# Altium footprint library hphonglib.PcbLib: 1250 footprints (part 50 of 79)
Each footprint in its own frame and in the unit in brackets; x right, y up, seen from the top. Pads: shape width x height; smd on the part's side, far side on the other; paste and mask are expansions set on the pad; w line width, h text height; cw(c..) or ccw(c..) is an arc to the next point about the centre after c.
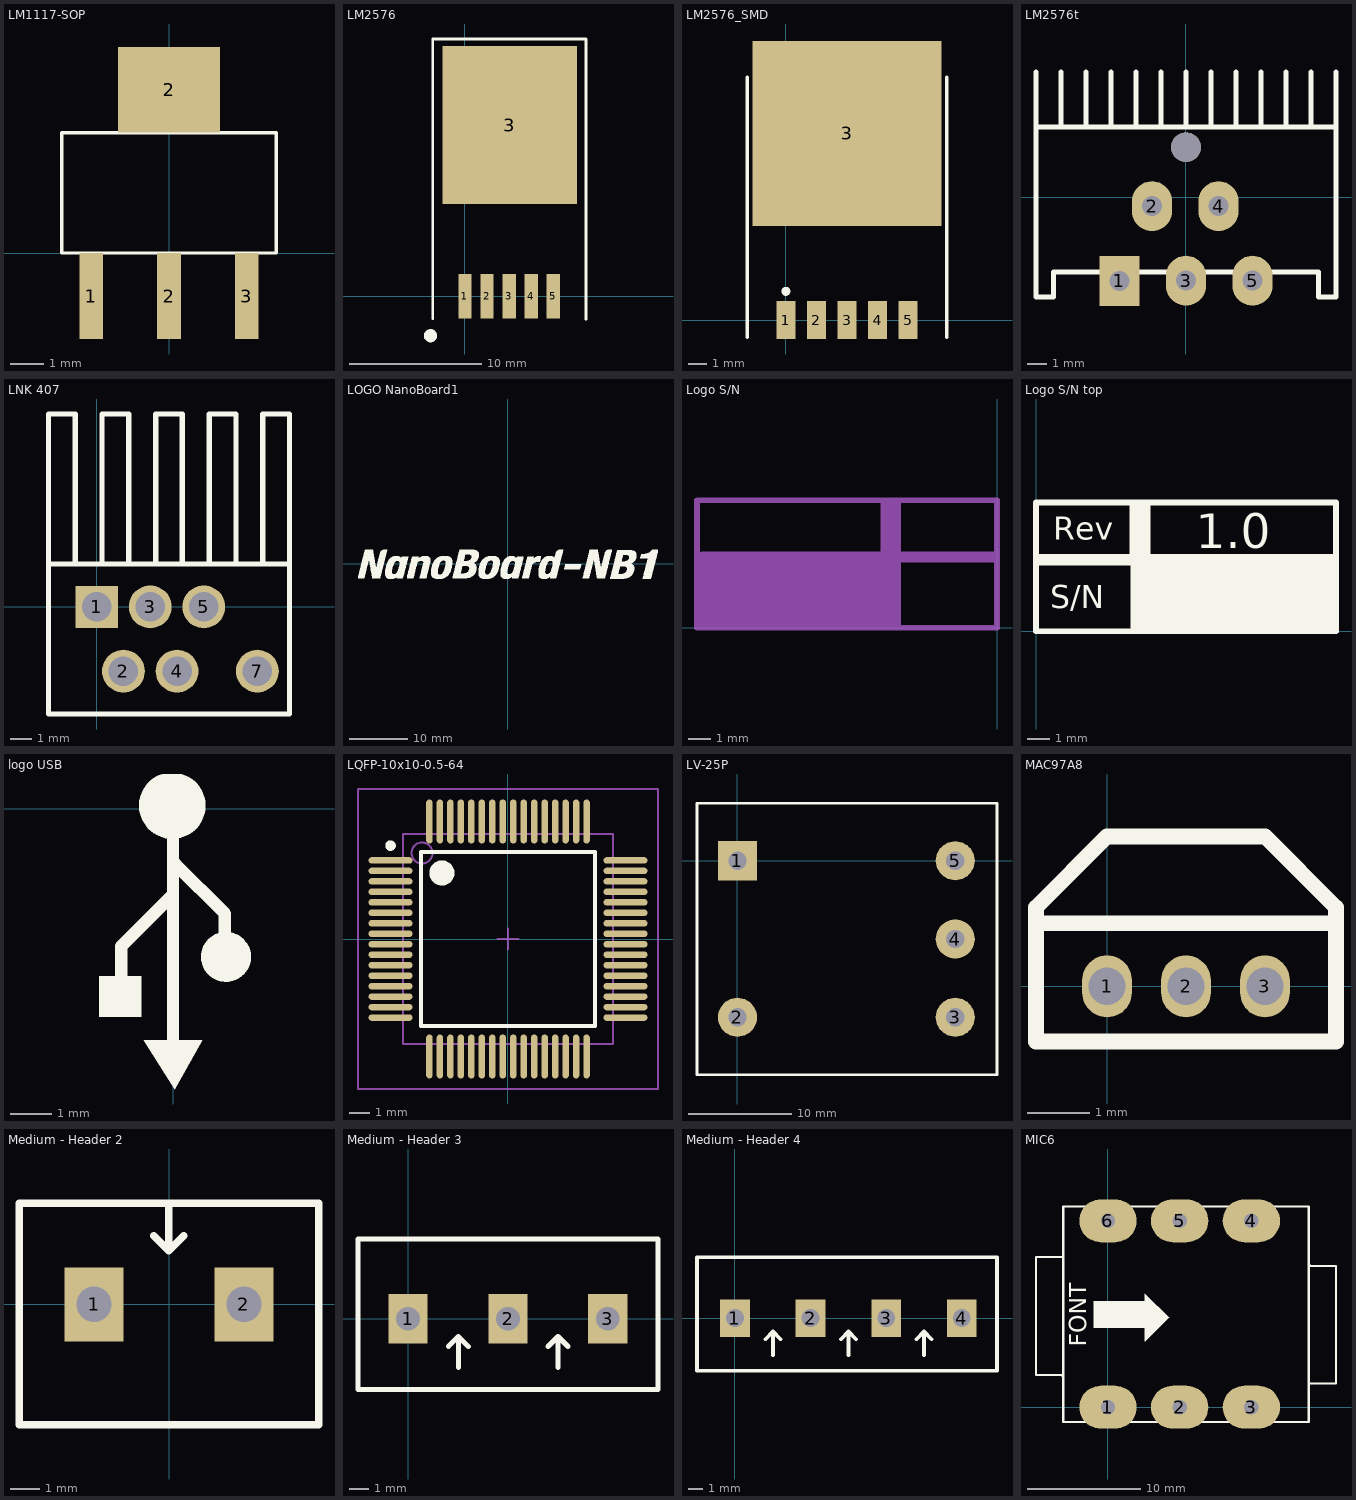
[diagram p49: the footprints below, top view; thin cyan lines are the x and y axes]

## LM1117-SOP [mm]
pads (4):
  rect 0.7x2.54 smd: 1(-2.3,-1.27) 2(0,-1.27) 3(2.3,-1.27)
  rect 3x2.54 smd: 2(0,4.826)
Top Overlay:
  lines w0.1: -3.175,0 -3.175,3.556 3.175,3.556 3.175,0 -3.175,0
3D body "SW3DPS-SOT-223-DEFAULT.step": height 1.68, standoff 0, extent -3.25,-1.778 3.25,5.182

## LM2576 [mm]
pads (6):
  rect 1x3.4 smd: 1(0,0) 2(1.68,0)
  rect 1.016x3.4 smd: 3(3.36,0) 4(5.04,0) 5(6.72,0)
  rect 10.25x12 smd mask+0.102: 3(3.404,13)
Top Overlay:
  circle w0.5: c-2.612,-2.997 r0.25
  lines w0.2: -2.438,-1.702 -2.438,19.533 9.195,19.533 9.195,12.968 9.195,-1.753
3D body "TO263-5.STEP": height 4.75, standoff -0.05, extent -1.647,-1.118 8.353,14.552

## LM2576_SMD [mm] "D2-PAK; 5 Leads; Body 14.4 (inc. leads) x 10.4 mm (LxW max)"
height 4.65
pads (6):
  rect 1.05x2.1 smd: 1(0,0) 2(1.7,0) 3(3.4,0) 4(5.1,0) 5(6.8,0)
  rect 10.5x10.3 smd: 3(3.404,10.389)
Top Overlay:
  circle w0.25: c0,1.6 r0.125
  lines w0.2: -2.15,-0.95 -2.15,13.5 ; 8.95,-0.95 8.95,13.5
3D body "TO263-5.STEP": height 5.18, standoff 0.38, extent -1.596,-0.381 8.404,15.289

## LM2576t [mil]
pads (6):
  rect 80x100 hole 40: 1(-132,-167.09)
  oval 80x100 hole 40: 2(-67,-18) 3(1,-167) 4(66,-18) 5(134,-167)
  round 59.06 hole 59.06: ""(1,100)
Top Overlay:
  lines w10: -299,140 301,140 ; -299,250 -299,-200 -264,-200 -264,-150 266,-150 266,-200 301,-200 301,250 ; -249,140 -249,250 ; -199,140 -199,250 ; -149,140 -149,250 ; -99,140 -99,250 ; -49,140 -49,250 ; 1,140 1,250 ; 51,140 51,250 ; 101,140 101,250 ; 151,140 151,250 ; 201,140 201,250 ; 251,140 251,250
3D body "SW3dPS-TO220-5.STEP": height 859.05, standoff -85.43, extent -199,-174.91 201,149.5
3D body "User Library-Heat Sink 6400BG.STEP": height 2499.68, standoff -177.48, extent -826.77,-300 826.77,700

## LNK 407 [mil] "Led lighting controller"
pads (6):
  rect 78.74x78.74 hole 55: 1(0,0)
  round 80 hole 55: 2(50,-120) 3(100,0) 4(150,-120) 5(200,0) 7(300,-120)
Top Overlay:
  lines w10: -40,80 -40,360 -90,360 -90,80 ; 10,80 10,360 60,360 60,80 ; 110,80 110,360 160,360 160,80 ; 210,80 210,360 260,360 260,80 ; 310,80 310,360 360,360 360,80 ; -90,80 360,80 ; -90,80 -90,-200 360,-200 360,80

## LOGO NanoBoard1 [mm] "NanoBoard Logo"
Top Overlay:
  drawing of 3535 lines, arcs and shapes, not listed

## Logo S/N [mm] "Logo S/N"
Bottom Overlay:
  rectangle: -13.335,0 -4.318,3.073
  rectangle: -5.232,3.429 -4.318,5.715
  lines w0.254: -13.462,0 -13.462,5.715 0,5.715 0,0 -13.462,0
  lines w0.508: -13.208,3.175 -0.127,3.175
  text "1.1" at -6.985,3.683 h1.52
  text "Rev" at -0.889,3.81 h1.02
  text "S/N" at -0.889,1.016 h1.02

## Logo S/N top [mm]
Top Overlay:
  rectangle: 4.166,3.429 5.08,5.715
  rectangle: 4.191,0 13.208,3.073
  lines w0.254: 0,0 0,5.715 13.335,5.715 13.335,0 0,0
  lines w0.508: 0.127,3.175 13.208,3.175
  text "1.0" at 7.112,3.683 h1.52
  text "S/N" at 0.635,1.016 h1.02
  text "Rev" at 0.762,4.064 h1.02

## logo USB [mm]
Top Overlay:
  circle w0.8: c-0.019,0.076 r0.4
  circle w0.6: c1.273,-3.556 r0.3
  region: -1.778,-4.014 -1.778,-5.004 -0.762,-5.004 -0.762,-4.014
  region: 0.038,-6.731 -0.699,-5.563 0.698,-5.563
  lines w0.2: 0.025,-1.324 0.05,-1.324
  lines w0.3: -1.245,-4.064 -1.245,-3.328 ; -1.245,-3.302 0,-2.058 ; 0,-5.665 0,-0.483 ; 0.05,-1.324 1.244,-2.518 1.244,-3.48

## LQFP-10x10-0.5-64 [mm] "Thin QFP, 64-Leads, Body 10x10mm, Pitch 0.5mm, IPC Low Density"
height 1.6
pads (64):
  oval 2.1x0.3 smd: 1(-5.6,3.75) 2(-5.6,3.25) 3(-5.6,2.75) 4(-5.6,2.25) 5(-5.6,1.75) 6(-5.6,1.25) 7(-5.6,0.75) 8(-5.6,0.25) 9(-5.6,-0.25) 10(-5.6,-0.75) 11(-5.6,-1.25) 12(-5.6,-1.75) 13(-5.6,-2.25) 14(-5.6,-2.75) 15(-5.6,-3.25) 16(-5.6,-3.75) 33(5.6,-3.75) 34(5.6,-3.25) 35(5.6,-2.75) 36(5.6,-2.25) 37(5.6,-1.75) 38(5.6,-1.25) 39(5.6,-0.75) 40(5.6,-0.25) 41(5.6,0.25) 42(5.6,0.75) 43(5.6,1.25) 44(5.6,1.75) 45(5.6,2.25) 46(5.6,2.75) 47(5.6,3.25) 48(5.6,3.75)
  oval 0.3x2.1 smd: 17(-3.75,-5.6) 18(-3.25,-5.6) 19(-2.75,-5.6) 20(-2.25,-5.6) 21(-1.75,-5.6) 22(-1.25,-5.6) 23(-0.75,-5.6) 24(-0.25,-5.6) 25(0.25,-5.6) 26(0.75,-5.6) 27(1.25,-5.6) 28(1.75,-5.6) 29(2.25,-5.6) 30(2.75,-5.6) 31(3.25,-5.6) 32(3.75,-5.6) 49(3.75,5.6) 50(3.25,5.6) 51(2.75,5.6) 52(2.25,5.6) 53(1.75,5.6) 54(1.25,5.6) 55(0.75,5.6) 56(0.25,5.6) 57(-0.25,5.6) 58(-0.75,5.6) 59(-1.25,5.6) 60(-1.75,5.6) 61(-2.25,5.6) 62(-2.75,5.6) 63(-3.25,5.6) 64(-3.75,5.6)
Top Overlay:
  circle w0.6: c-3.15,3.15 r0.3
  circle w0.25: c-5.6,4.45 r0.125
  lines w0.2: -4.15,-4.15 4.15,-4.15 4.15,4.15 -4.15,4.15 -4.15,-4.15
Mechanical 13:
  circle w0.1: c-4.1,4.1 r0.5
  lines w0.1: -5,-5 5,-5 5,5 -5,5 -5,-5
Mechanical 15:
  lines w0.1: -0.5,0 0.5,0 ; 0,-0.5 0,0.5 ; -7.15,-7.15 7.15,-7.15 7.15,7.15 -7.15,7.15 -7.15,-7.15
3D body "QFP-12x12-0.5-64.step": height 1.35, standoff 0, extent -6.014,-6.014 6.014,6.014

## LV-25P [mil] "Voltage Transducer LV Series; 500V"
pads (5):
  rect 150x150 hole 70: 1(0,0)
  round 150 hole 70: 2(0,-600) 3(835,-600) 4(835,-300) 5(835,0)
Top Overlay:
  lines w10: -155,-820 -155,220 995,220 995,-820 -155,-820
3D body "User Library-LEM_Voltage_Transducer_LV25P_SP2.STEP": height 624.49, standoff -147.17, extent -104.8,-811.8 1044.8,211.82

## MAC97A8 [mm]
pads (3):
  oval 0.8x1 hole 0.6: 1(0,0) 2(1.27,0) 3(2.54,0)
Top Overlay:
  lines w0.254: -1.143,1.016 -1.143,-0.889 3.683,-0.889 3.683,1.016 ; -1.143,1.016 -1.143,1.27 0,2.413 2.54,2.413 3.683,1.27 3.683,1.016 ; -1.143,1.016 3.683,1.016

## Medium - Header 2 [mm]
pads (2):
  rect 2x2.5 hole 1.2: 1(-2.54,0) 2(2.54,0)
Top Overlay:
  lines w0.254: -0.521,2.324 -0.013,1.816 ; -0.013,3.378 -0.013,1.816 ; 0.495,2.324 -0.013,1.816 ; -5.08,-4.077 5.08,-4.077 5.08,3.429 -5.08,3.429 -5.08,-4.077
3D body "SW3DPS-HDR1x2-MED-GREEN.STEP": height 10, standoff -4, extent -5,-4.071 5,3.429

## Medium - Header 3 [mm]
pads (3):
  rect 2x2.5 hole 1.2: 1(0,0) 2(5.08,0) 3(10.147,0)
Top Overlay:
  lines w0.254: 2.045,-1.41 2.553,-0.902 ; 2.553,-2.464 2.553,-0.902 ; 3.061,-1.41 2.553,-0.902 ; 7.112,-1.41 7.62,-0.902 ; 7.62,-2.464 7.62,-0.902 ; 8.128,-1.41 7.62,-0.902 ; -2.54,-3.581 12.7,-3.581 12.7,4.064 -2.54,4.064 -2.54,-3.581
3D body "SW3DPS-HDR1x3-MED-GREEN.STEP": height 10, standoff -4, extent -2.42,-3.505 12.58,3.995

## Medium - Header 4 [mm]
pads (4):
  rect 2x2.5 hole 1.2: 1(0,0) 2(5.08,0) 3(10.147,0) 4(15.215,0)
Top Overlay:
  lines w0.254: 2.045,-1.41 2.553,-0.902 ; 2.553,-2.464 2.553,-0.902 ; 3.061,-1.41 2.553,-0.902 ; 7.112,-1.41 7.62,-0.902 ; 7.62,-2.464 7.62,-0.902 ; 8.128,-1.41 7.62,-0.902 ; 12.179,-1.41 12.687,-0.902 ; 12.687,-2.464 12.687,-0.902 ; 13.195,-1.41 12.687,-0.902 ; -2.54,-3.531 17.577,-3.531 17.577,4.089 -2.54,4.089 -2.54,-3.531
3D body "SW3DPS-HDR1x4-MED-GREEN.STEP": height 10, standoff -4, extent -2.431,-3.461 17.569,4.039

## MIC6 [mm] "Jac Mic 6 pin to"
pads (6):
  oval 5.08x3.81 hole 1.27: 1(0,0) 2(6.35,0) 3(12.7,0) 4(12.7,16.51) 5(6.35,16.51) 6(0,16.51)
Top Overlay:
  region: -1.27,9.373 -1.27,7.036 3.302,7.036 3.277,7.061 3.277,5.842 3.302,5.842 5.385,7.925 5.41,7.925 3.277,10.058 3.277,9.373
  lines w0.178: -3.962,-1.295 -3.962,17.755 ; -3.962,2.261 -3.962,13.335 -4.013,13.284 -6.375,13.284 -6.375,2.845 -4.115,2.845 -3.962,2.692 ; -3.962,17.78 17.78,17.78 17.78,14.986 ; -3.937,-1.321 -3.912,-1.295 -3.886,-1.321 17.78,-1.321 17.78,2.083 ; 17.78,12.675 17.932,12.522 20.193,12.522 20.193,2.083 17.831,2.083 17.78,2.032 17.78,15.088
  text "FONT" at -1.905,5.334 h1.52